# Altium integrated library Telephone.IntLib: 113 symbols (continued)
## CMP-009-00314-1
designator R?  value 47k  (hidden comment: CMP-009-00314-1)
High Precision-High Stability Chip Resistor Thin Film 0805 47kOhm 1% Paper T/R; Manufacturer: Yageo; Manufacturer Part Number: RT0805FRE0747KL; Power Rating: 125mW; Voltage Rating: 150V; Temperature Coefficient: 50ppm/°C; RoHS: Yes; Category: Chip SMD Resistors; Stock 1: 83330; Pricing 1: 1=0.1, 10=0.081, 50=0.081, 100=0.031, 1000=0.014, 10000=0.009 (USD); Case/Package: 0805; Case Code (Metric): 2012; Min Operating Temperature: -55°C; Max Operating Temperature: 125°C; Tolerance: 1%; Packaging: Tape and Reel; Resistor Type: Thin Film; Termination: SMD/SMT; Number of Terminations: 2; Max Power Dissipation: 125mW; Voltage Rating (DC): 150V; Features: Moisture Resistant; Series: RT; Resistance Tolerance: 1%; Length: 0.079inch; Width: 0.049inch; Height: 0.024inch; Reach SVHC Compliant: No; Lead Free: Lead Free; RoHS Compliant: Yes; ComponentLink1URL: https://datasheet.ciiva.com/7942/1392914-7942152.pdf?src-supplier=Element14; ComponentLink1Description: https://datasheet.ciiva.com/7942/1392914-7942152.pdf?src-supplier=Element14; ComponentLink2URL: https://datasheet.ciiva.com/7942/1392914-7942153.pdf?src-supplier=Element14; ComponentLink2Description: https://datasheet.ciiva.com/7942/1392914-7942153.pdf?src-supplier=Element14; ComponentLink3URL: https://datasheet.ciiva.com/5990/1392914-5990606.pdf?src-supplier=Farnell; ComponentLink3Description: https://datasheet.ciiva.com/5990/1392914-5990606.pdf?src-supplier=Farnell; Pins: 2; Design Item ID: RT0805FRE0747KL; Component Type: Standard; Pin Count: 2; Source: V4-TEL.SCHLIB; Component Type: Resistors
footprint 0805
pins: 1, 2

## CMP-009-00315-1
designator R?  value 2.2k  (hidden comment: CMP-009-00315-1)
anti-surge endured pulse power thick film chip resistor, 0805, RoHS; Manufacturer: KOA Speer; Manufacturer Part Number: SG73P2ATTD222J; Voltage Rating: 150V; Power Rating: 250mW; Tolerance: 5%; Temperature Coefficient: 100ppm/°C; RoHS: Yes; Category: Chip SMD Resistors; Stock 1: 15000; Pricing 1: 1=0.13, 10=0.113, 50=0.113, 100=0.043, 1000=0.018, 10000=0.013 (USD); Case/Package: 0805; Case Code (Metric): 2012; Weight: 0.000194oz; Min Operating Temperature: -55°C; Max Operating Temperature: 155°C; Packaging: Tape and Reel; Termination: SMD/SMT; Voltage Rating (DC): 150V; Series: SG73P; Features: Moisture Resistant,Automotive AEC-Q200; Max Power Dissipation: 250mW; Number of Terminations: 2; Length: 2mm; Width: 1.25mm; Height: 0.5mm; Ratings: AEC-Q200; RoHS Compliant: Yes; ComponentLink1URL: https://datasheet.ciiva.com/5568/sg73-5568998.pdf?src-supplier=Mouser; ComponentLink1Description: https://datasheet.ciiva.com/5568/sg73-5568998.pdf?src-supplier=Mouser; Design Item ID: SG73P2ATTD222J; Component Type: Standard; Pin Count: 2; Source: V4-TEL.SCHLIB; Component Type: Resistors
footprint 0805
pins: 1, 2

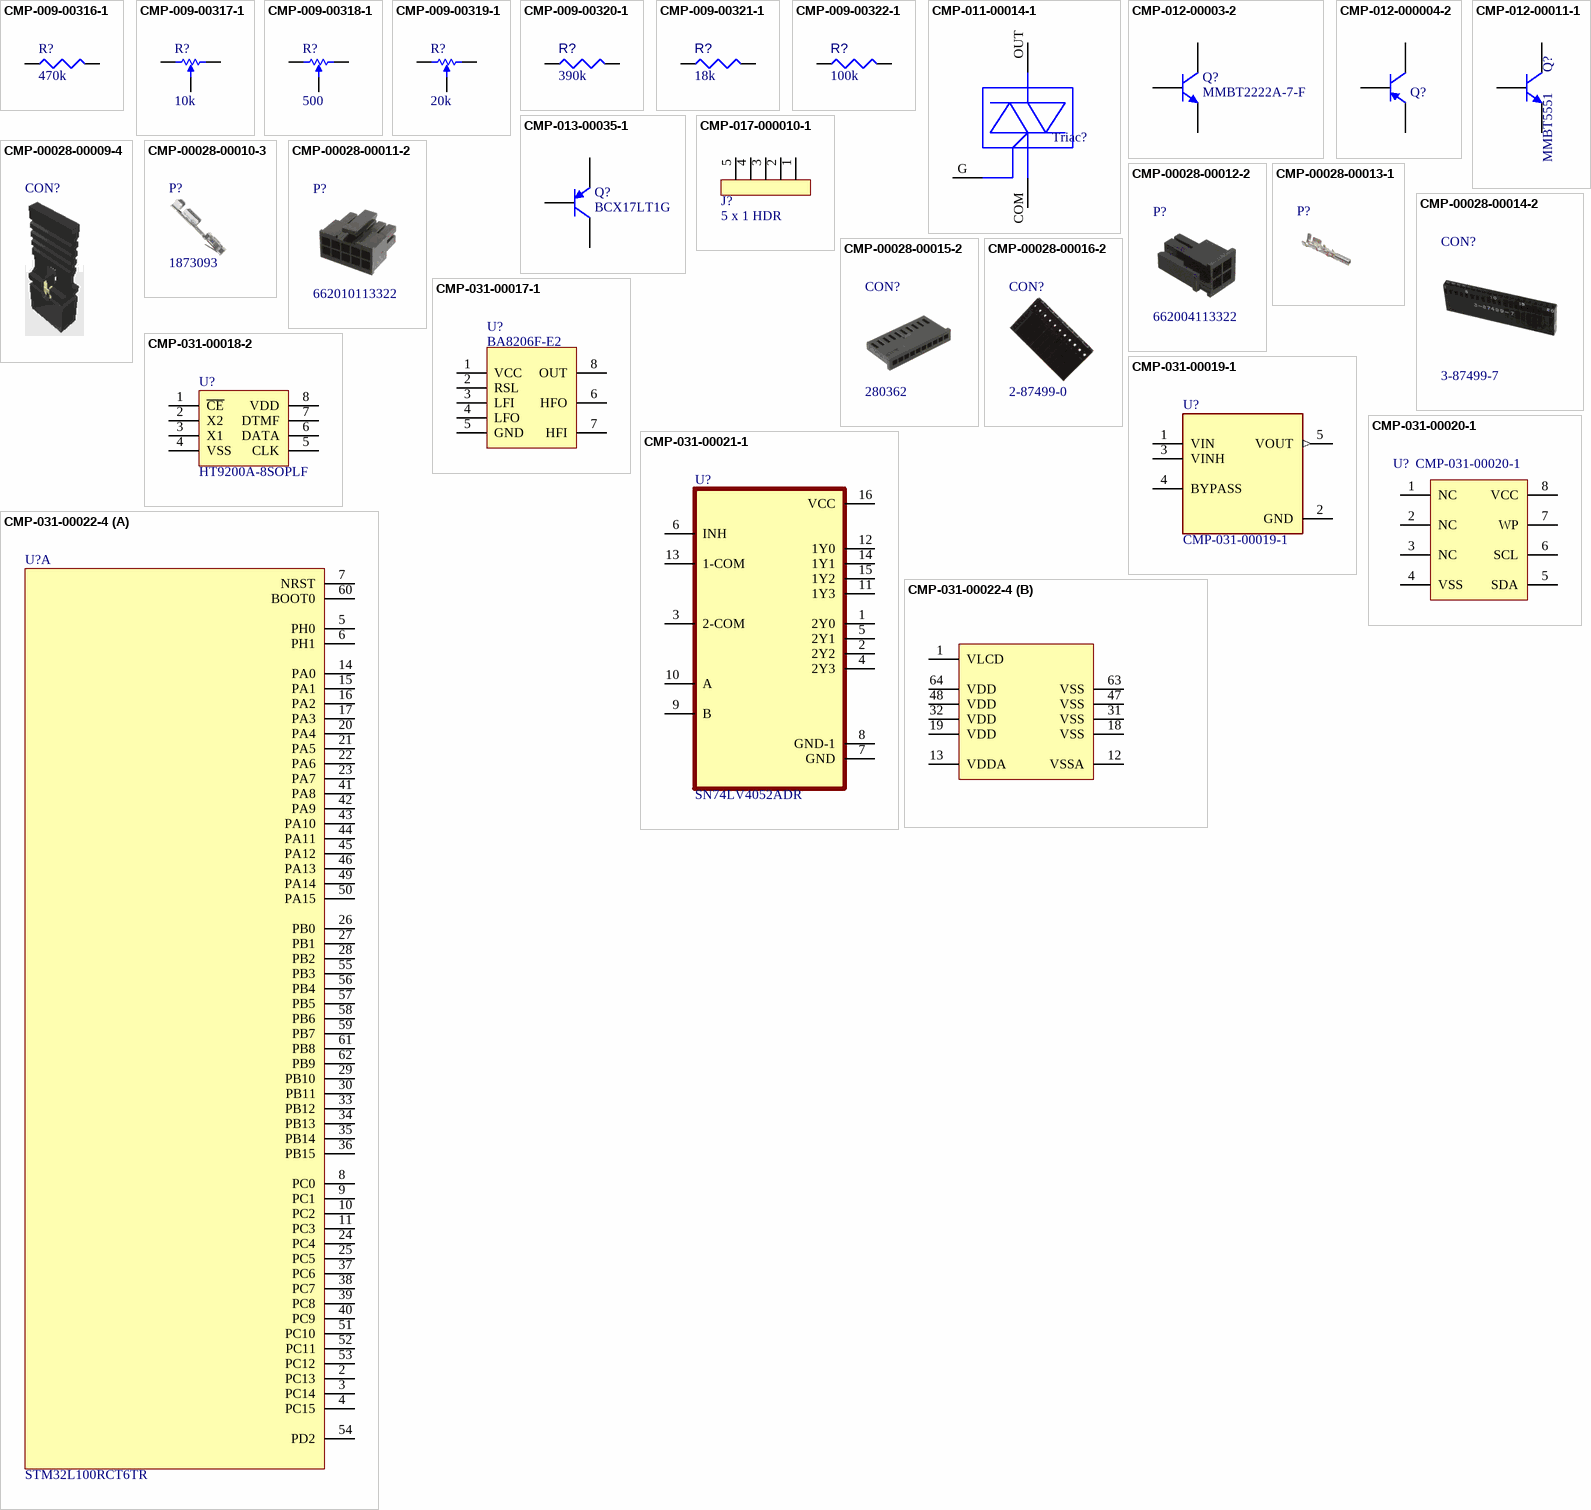
[diagram p2: symbols CMP-009-00316-1 to CMP-031-00022-4]

## CMP-009-00316-1
designator R?  value 470k  (hidden comment: CMP-009-00316-1)
Surface Mount Chip Resistor, Thick Film, Aec-Q200 Wcr Series, 470 Kohm, 125 Mw, 1%, 150 V Rohs Compliant: Yes; Manufacturer: TT Welwyn; Manufacturer Part Number: WCR0805-470KFI; Power Rating: 125mW; Voltage Rating: 150V; Insulation Resistance: 1GR; Temperature Coefficient: 100ppm/°C; RoHS: Yes; Category: Chip SMD Resistors; Stock 1: 11638; Pricing 1: 1=0.1, 10=0.084, 50=0.084, 100=0.033, 1000=0.015, 10000=0.01 (USD); Case/Package: 0805; Case Code (Metric): 2012; Min Operating Temperature: -55°C; Max Operating Temperature: 155°C; Packaging: Cut Tape; Resistor Type: Thick Film; Voltage Rating (DC): 150V; Resistance Tolerance: 1%; Series: WCR; Width: 1.25mm; Reach SVHC Compliant: No; RoHS Compliant: Yes; ComponentLink1URL: https://datasheet.ciiva.com/7867/1851687-7867286.pdf?src-supplier=Element14; ComponentLink1Description: https://datasheet.ciiva.com/7867/1851687-7867286.pdf?src-supplier=Element14; ComponentLink2URL: https://datasheet.ciiva.com/7867/1851687-7867287.pdf?src-supplier=Element14; ComponentLink2Description: https://datasheet.ciiva.com/7867/1851687-7867287.pdf?src-supplier=Element14; Pins: 2; Design Item ID: WCR0805-470KFI; Component Type: Standard; Pin Count: 2; Source: V4-TEL.SCHLIB; Component Type: Resistors
footprint 0805
pins: 1, 2

## CMP-009-00317-1
designator R?, comment value 10k  (hidden comment: TC33X-2-103G)
Res Trimmer 10K Ohm 25% 1/10W 1(Elec)/1(Mech)Turn (3 X 3.8mm) Foot Print SMD Embossed T/R; Manufacturer: Bourns; Max Power Dissipation: 100mW; Temperature Coefficient: 250ppm/°C; Max Operating Temperature: 100°C; Min Operating Temperature: -40°C; Mounting Technology: Surface Mount; RoHS Compliant: Yes; Tolerance: 25%; Depth: 3.8mm; Height: 0.047inch; Length: 0.15inch; Military Standard: Not; Package Quantity: 9000; Packaging: Tape and Reel; Power Rating: 100mW; Radiation Hardening: No; Resistor Type: Cermet; Series: Trimpot® TC33 - Open Frame; Termination: SMD/SMT; Width: 0.118inch; Manufacturer Part Number: TC33X-2-103G; Component Type: Resistors
footprint BI-35WR10KLFTR-3_V (SMD, 3-Leads, Body 3x3.1mm)
pins: 1, 2, 3

## CMP-009-00318-1
designator R?, comment value 500  (hidden comment: TC33X-2-501E)
Res Trimmer 500 Ohm 25% 1/10W 1(Elec)/1(Mech)Turn (3 X 3.8mm) Foot Print SMD Embossed T/R; Manufacturer: Bourns; Power: 100mW; Number of Turns: 1; Temperature Coefficient: 250ppm/°C; Case/Package: TC33X-2; RoHS Compliant: Yes; Mounting Technology: Surface Mount; Max Operating Temperature: 100°C; Min Operating Temperature: -40°C; Tolerance: 25%; Height: 0.047inch; Length: 0.15inch; Max Power Dissipation: 100mW; Package Quantity: 1; Packaging: Tape and Reel; Power Rating: 100mW; Radiation Hardening: No; Reach SVHC Compliant: No; Resistance Tolerance: 25%; Resistor Type: Cermet; Series: Trimpot® TC33 - Open Frame; Termination: SMD/SMT; Width: 0.118inch; Manufacturer Part Number: TC33X-2-501E; Component Type: Resistors
footprint BOUR-TC33X-2_V (SMD, 3-Leads, Body 3.8x3.6mm)
pins: 1, 2, 3

## CMP-009-00319-1
designator R?, comment value 20k  (hidden comment: TC33X-2-203E)
Res Trimmer 20K Ohm 25% 1/10W 1(Elec)/1(Mech)Turn (3 X 3.8mm) Foot Print SMD Embossed T/R; Manufacturer: Bourns; Power: 100mW; Number of Turns: 1; Temperature Coefficient: 250ppm/°C; RoHS Compliant: Yes; Mounting Technology: Surface Mount; Max Operating Temperature: 100°C; Min Operating Temperature: -40°C; Tolerance: 25%; Pins: 3; Depth: 3.8mm; Height: 0.047inch; Length: 3mm; Max Power Dissipation: 100mW; Military Standard: Not; Package Quantity: 1; Packaging: Tape and Reel; Power Rating: 100mW; Radiation Hardening: No; Reach SVHC Compliant: No; Resistance Tolerance: 25%; Resistor Type: Cermet; Series: TC33; Termination: Foot Print; Width: 0.118inch; Manufacturer Part Number: TC33X-2-203E; Component Type: Resistors
footprint BOUR-TC33X-2_V (SMD, 3-Leads, Body 3.8x3.6mm)
pins: 1, 2, 3

## CMP-009-00320-1
designator R?  value 390k  (hidden comment: CMP-009-00320-1)
Chip Resistor Precision Grade Thick Film 0805 390kOhm 1% Paper T/R; Manufacturer: Yageo; Manufacturer Part Number: RE0805FRE07390KL; Max Power Dissipation: 125mW; Temperature Coefficient: 50ppm/°C; Case/Package: 0805; Min Operating Temperature: -55°C; Max Operating Temperature: 155°C; Packaging: Tape and Reel; Number of Terminations: 2; Tolerance: 1%; Features: Moisture Resistant; Series: RE; Length: 0.079inch; Width: 0.049inch; Height: 0.024inch; Lead Free: Lead Free; RoHS Compliant: Yes; Component Type: Resistors
footprint R0805
pins: 1, 2
1 alternate drawing of the same symbol

## CMP-009-00321-1
designator R?  value 18k  (hidden comment: CMP-009-00321-1)
Res Thick Film 0805 18K Ohm 1% 1/8W ±100ppm/°C Molded SMD SMD Paper T/R; Manufacturer: Yageo; Manufacturer Part Number: RC0805FR-1018KL; Power: 125mW; Case/Package: 0805; Contact Plating: Tin,Matte; Min Operating Temperature: -55°C; Max Operating Temperature: 155°C; Tolerance: 1%; RoHS Compliant: Yes; Mounting Technology: SMT; Pins: 2; Component Type: Resistors
footprint R0805
pins: 1, 2
1 alternate drawing of the same symbol

## CMP-009-00322-1
designator R?, comment value 100k  (hidden comment: RC0805FR-07100KL)
Res Thick Film 0805 100K Ohm 1% 1/8W ±100ppm/°C Molded SMD Paper T/R; Manufacturer: Yageo; Power: 125mW; Voltage Rating: 150V; Case/Package: 0805; Pins: 2; RoHS Compliant: True; Mounting Technology: SM; Tolerance: 1%; Max Operating Temperature: 155°C; Min Operating Temperature: -55°C; Contact Plating: Tin,Matte; Height: 500um; Lead Free: Lead Free; Length: 2mm; Packaging: Cut Tape; Radiation Hardening: No; Reach SVHC Compliant: Yes; Resistor Type: Thick Film; Temperature Coefficient: 100ppm/°C; Voltage Rating (DC): 150V; Width: 1.25mm; Manufacturer Part Number: RC0805FR-07100KL; Component Type: Resistors
footprint R0805
pins: 1, 2
1 alternate drawing of the same symbol

## CMP-011-00014-1
designator Triac?, comment ACST210-8BTR  (value not drawn)
Triacs Triac Crowbar 10mA Switch 2A 800V; Manufacturer 1: STMicroelectronics; Element Configuration: Single; RoHS: Yes; Category: TRIACs; Pricing 1: 1=0.75000, 10=0.65700 (USD); Mount: Surface Mount; Case/Package: DPAK; Weight: 0.009185oz; Min Operating Temperature: -40°C; Max Operating Temperature: 125°C; Packaging: Tape and Reel; Package Quantity: 2500; RMS Current (Irms): 2A; Hold Current: 10mA; Series: ACS™/A.S.D®; Radiation Hardening: No; Lead Free: Lead Free; RoHS Compliant: Yes; ComponentLink1URL: https://datasheet.ciiva.com/15140/getdatasheetpartid-256875-15140675.pdf?src-supplier=Verical; ComponentLink1Description: https://datasheet.ciiva.com/15140/getdatasheetpartid-256875-15140675.pdf?src-supplier=Verical; Pins: 3; Voltage Rating: 800V; Design Item ID: ACST210-8BTR; Contact Plating: Tin,Matte; Manufacturer Part Number 1: ACST210-8BTR; Source: PTZLib.SchLib; Stock 1: 60; ComponentLink2Description: https://datasheet.ciiva.com/17423/cd00153575-17423141.pdf?src-supplier=Avnet+Europe; ComponentLink2URL: https://datasheet.ciiva.com/17423/cd00153575-17423141.pdf?src-supplier=Avnet+Europe; Component Type: Switches
footprint ACST210_DPAK
pins: COM 3, G 2, OUT 1

## CMP-012-00003-2
designator Q?, comment MMBT2222A-7-F
MMBT2222 Series NPN 350 mW 40 V 600 mA SMT Small Signal Transistor - SOT-23; Manufacturer: Diodes; Manufacturer: Multicomp; Current Rating: 600mA; Voltage Rating: 40V; Collector Base Voltage (VCBO): 75V; Collector Emitter Saturation Voltage: 1V; Current: 1A; Element Configuration: Single; Emitter Base Voltage (VEBO): 6V; Frequency: 300MHz; hFE Min: 100; Max Power Dissipation: 300mW; Number of Elements: 1; Power Dissipation: 350mW; Case/Package: SOT-23-3; Pins: 3; RoHS Compliant: Yes; Min Operating Temperature: -55°C; Max Operating Temperature: 150°C; Design Item ID: MMBT2222A-7-F; Category: BJTs; Collector Emitter Breakdown Voltage: 40V; Collector Emitter Voltage (VCEO): 40V; Collector-emitter Voltage-Max: 1V; Component Type: Standard; Contact Plating: Tin,Matte; Continuous Collector Current: 600mA; Gain Bandwidth Product: 300MHz; Height: 1mm; Lead Free: Lead Free; Length: 3.05mm; Manufacturer Part Number: MMBT2222A-7-F; Max Collector Current: 600mA; Max Frequency: 300MHz; Mount: Surface Mount; Package Quantity: 3000; Packaging: Tape and Reel; Pin Count: 3; Polarity: NPN; Pricing 1: 1=0.14000, 10=0.13300, 50=0.13300, 100=0.07200, 500=0.04500, 1000=0.03100, 3000=0.02300, 9000=0.02000, 10000=0.02000, 24000=0.01800, 45000=0.01500 (USD); Radiation Hardening: No; Reach SVHC Compliant: Yes; RoHS: Yes; Series: Automotive, AEC-Q101; Source: PTZ.SCHLIB; Stock 1: 1743698; Termination: SMD/SMT; Transition Frequency: 300MHz; Voltage: 40V; Voltage Rating (DC): 40V; Weight: 0.000282oz; Width: 1.4mm; ComponentLink1Description: https://datasheet.ciiva.com/15139/getdatasheetpartid-82692-15139078.pdf?src-supplier=Verical; ComponentLink1URL: https://datasheet.ciiva.com/15139/getdatasheetpartid-82692-15139078.pdf?src-supplier=Verical; ComponentLink2Description: https://datasheet.ciiva.com/8029/ds30041-8029709.pdf?src-supplier=Element14; ComponentLink2URL: https://datasheet.ciiva.com/8029/ds30041-8029709.pdf?src-supplier=Element14; ComponentLink3Description: https://datasheet.ciiva.com/11201/ds30041-11201864.pdf?src-supplier=Avnet; ComponentLink3URL: https://datasheet.ciiva.com/11201/ds30041-11201864.pdf?src-supplier=Avnet; ComponentLink4Description: https://datasheet.ciiva.com/16199/ds30041-16199045.pdf?src-supplier=Future+Electronics; ComponentLink4URL: https://datasheet.ciiva.com/16199/ds30041-16199045.pdf?src-supplier=Future+Electronics; ComponentLink5Description: https://datasheet.ciiva.com/11198/ds30041-11198965.pdf?src-supplier=Avnet; ComponentLink5URL: https://datasheet.ciiva.com/11198/ds30041-11198965.pdf?src-supplier=Avnet; ComponentLink6Description: https://datasheet.ciiva.com/972/ds30041-972551.pdf?src-supplier=Digi-Key; ComponentLink6URL: https://datasheet.ciiva.com/972/ds30041-972551.pdf?src-supplier=Digi-Key; ComponentLink7Description: https://datasheet.ciiva.com/972/ds30041-972552.pdf?src-supplier=Digi-Key; ComponentLink7URL: https://datasheet.ciiva.com/972/ds30041-972552.pdf?src-supplier=Digi-Key; ComponentLink8Description: https://datasheet.ciiva.com/972/ds30041-972550.pdf?src-supplier=Digi-Key; ComponentLink8URL: https://datasheet.ciiva.com/972/ds30041-972550.pdf?src-supplier=Digi-Key; Component Type: Transformers
footprint SOT23127P600-8N
pins: 1 E, 2 B, 3 C

## CMP-012-000004-2
designator Q?, comment MPSA92PBFREE  (value not drawn)
MPSA92 Series 300 V 500 mA PNP Through Hole Silicon Transistor - TO-92; Manufacturer: Central Semiconductor; Manufacturer Part Number: MPSA92PBFREE; RoHS: Yes; Stock 1: 81433; Pricing 1: 1=0.51, 10=0.438, 50=0.438, 100=0.327, 1000=0.19, 10000=0.146 (USD); Design Item ID: MPSA92PBFREE; Source: V4-TEL.SCHLIB; Component Type: Standard; Pin Count: 3; Component Type: Mechanicals
footprint UNIC-TO-92-3 (TO-92, 3-Leads, Dia 4.58mm, Pitch 1.27mm)
pins: 1 E, 2 B, 3 C

## CMP-012-00011-1
designator Q?, comment MMBT5551
Bipolar Transistor, SOT-23, 160V, 600mA; Manufacturer: ON Semiconductor; Manufacturer Part Number: MMBT5551LT1G; Manufacturer: Diodes; Case/Package: SOT-23; RoHS Compliant: Yes; Reach SVHC Compliant: Yes; Manufacturer Part Number: MMBT5551; Component Type: Transformers
footprint SOT23127P600-8N
pins: 1 E, 2 B, 3 C

## CMP-013-00035-1
designator Q?, comment BCX17LT1G
ON Semi BCX17LT1G PNP Bipolar Transistor; 0.5 A; 45 V; 3-Pin SOT-23; Manufacturer: ON Semiconductor; Manufacturer: Rochester Electronics; Manufacturer Part Number: NSVBCX17LT1G; Nominal Vgs: 5V; Continuous Collector Current: 500mA; Case/Package: SOT-23-3; Min Operating Temperature: -55°C; Pins: 3; Max Operating Temperature: 150°C; Mounting Technology: SMD/SMT; Transistor Type: PNP; Manufacturer Part Number: BCX17LT1G; Component Type: Transistors
footprint FAIR-SOT23-3_V (SOT23, 3-Leads, Body 3.12x1.5mm, Pitch 0.95mm)
pins: 1 B, 2 E, 3 C

## CMP-017-000010-1
designator J?, comment 5 x 1 HDR
Manufacturer Part # :   9-146278-0; Design Item ID: 5 x 1 HDR; Source: PTZLib.SchLib
footprint HDR_male_1x5_2.54mm
pins: 1, 2, 3, 4, 5

## CMP-00028-00009-4
designator CON?, comment 609002115121  (value not drawn)  (mechanical)
Insulated WR-PHD Jumper with Testpoint, 3A, 1 x 2, 2.54mm Pitch; Pins: 2; Component Type: Mechanical
footprint 609002115121-Footprint-1

## CMP-00028-00010-3
designator P?, comment 1873093  (mechanical)
CONN SOCKET 20-24AWG TIN CRIMP; Manufacturer: TE Connectivity; Approvals: CSA; Contact Current Rating: 3A; Contact Resistance: 12mR; Gender: Female; Insulation Diameter: 1.75mm; Insulation Resistance: 5GR; Shielding: Unshielded; Voltage Rating (AC): 250V; Wire Gauge (Max): 20AWG; Wire Gauge (Min): 24AWG; Wire/Cable Type: Discrete; Max Operating Temperature: 105°C; Min Operating Temperature: -65°C; Mounting Technology: Cable; Connector Type: Socket; Contact Gender: Female; Contact Material: Bronze; Contact Plating: Tin; Contact Type: Signal; Current Rating: 3A; Depth: 2.41mm; ELV: Compliant; Height: 2.03mm; Lead Free: Lead Free; Length: 12.24mm; Orientation: Straight; Package Quantity: 1000; Packaging: Loose Piece; Reach SVHC Compliant: No; Series: AMPMODU Mod V; Termination: Crimp; Wire/Cable Gauge: 24AWG; Manufacturer Part Number: 1873093; Component Type: Mechanical

## CMP-00028-00011-2
designator P?, comment 662010113322  (mechanical)
WR-MPC3 Series 3mm Pitch 10 Way 2 Row Female Straight PCB Connector Housing 6620; Manufacturer: Wurth Electronics; Connector Type: Receptacle; Current Rating: 5A; Insulation: Insulated; Insulation Resistance: 1GR; Number of Contacts: 10; Voltage Rating: 250V; Max Operating Temperature: 105°C; Min Operating Temperature: -25°C; Mounting Technology: Free Hanging; RoHS Compliant: Yes; Color: Black; Contact Gender: Female; Contact Type: Female Socket; Fastening Type: Latch; Flammability Rating: UL94 V-0; Gender: Receptacle; Height: 14mm; Housing Material: Nylon; Length: 15.85mm; Number of Positions: 10; Number of Rows: 2; Packaging: Tray; Pitch: 3mm; Reach SVHC Compliant: Unknown; Series: WR-MPC3; Termination: Crimp; Width: 15.85mm; Manufacturer Part Number: 662010113322; Component Type: Mechanical
footprint 662010113322-Footprint-1

## CMP-00028-00012-2
designator P?, comment 662004113322  (mechanical)
WR-MPC3 Series 3mm Pitch 4 Way 2 Row Female Straight PCB Connector Housing 6620; Manufacturer: Wurth Electronics; Connector Type: Receptacle; Current Rating: 5A; Insulation Resistance: 1GR; Number of Contacts: 4; Voltage Rating: 250V; Max Operating Temperature: 105°C; Min Operating Temperature: -25°C; Mounting Technology: Free Hanging; RoHS Compliant: Yes; Color: Black; Contact Type: Female Socket; Fastening Type: Latch; Flammability Rating: UL94 V-0; Gender: Receptacle; Height: 14mm; Housing Material: Nylon; Length: 10.6mm; Number of Positions: 4; Number of Rows: 2; Packaging: Bulk; Pitch: 3mm; Reach SVHC Compliant: Unknown; Row Spacing: 3mm; Series: WR-MPC3; Termination: Crimp; Width: 6.85mm; Manufacturer Part Number: 662004113322; Component Type: Mechanical
footprint 662004113322-Footprint-1

## CMP-00028-00013-1
designator P?, comment 66200113722DEC  (value not drawn)  (mechanical)
WR-MPC3 Series Female Tin Plated CopperAlloy DIN Connector Contact; Manufacturer: Wurth Electronics; Contact Design: STAMPED; Current Rating: 5A; Pitch: 3mm; Wire Gauge (Max): 24AWG; Wire Gauge (Min): 20AWG; Pins: 1; Contact Gender: Female; Contact Material: Copper,Tin; Contact Plating: Tin; Height: 2.4mm; Length: 2.6mm; Reach SVHC Compliant: Unknown; Series: WR-MPC3; Termination: Crimp; Width: 15.3mm; Manufacturer Part Number: 66200113722DEC; Component Type: Mechanical

## CMP-00028-00014-2
designator CON?, comment 3-87499-7  (mechanical)
Housing, Crimp / Snap, Single Row, 20 250 VAC, 3 A 750 V, AMPMODU Mod IV Series; Manufacturer: TE Connectivity; Approvals: CSA; Connector Type: Receptacle,Socket; Contact Current Rating: 3A; Gender: Receptacle; Insulation Resistance: 5GR; Mating Alignment: No (Without); Max Voltage Rating (AC): 250V; Number of Contacts: 20; Pitch: 2.54mm; Row Spacing: 0.1inch; Max Operating Temperature: 105°C; Min Operating Temperature: -65°C; Mounting Technology: Free Hanging,Cable; Pins: 20; Color: Black; Contact Material: Copper; Contact Type: Male or Female; Current Rating: 3A; Depth: 15.24mm; ELV: Compliant; Flammability Rating: UL94 V-0; Height: 0.14inch; Housing Color: Black; Housing Material: Thermoplastic; Lead Free: Lead Free; Length: 2.01inch; Mating Connector Lock: No (Without); Number of Positions: 20; Number of Rows: 1; Orientation: Straight; Package Quantity: 200; Packaging: Bag; Reach SVHC Compliant: Unknown; Series: AMPMODU MOD IV; Strain Relief: No (Without); Termination: Crimp; Voltage Rating (AC): 250V; Width: 15.24mm; Manufacturer Part Number: 3-87499-7; Component Type: Mechanical

## CMP-00028-00015-2
designator CON?, comment 280362  (mechanical)
Headers & Wire Housings 10 POS RECPT; Manufacturer: TE Connectivity; Pins: 10; Manufacturer Part Number: 280362; Component Type: Mechanical

## CMP-00028-00016-2
designator CON?, comment 2-87499-0  (mechanical)
Conn Housing RCP 11 POS 2.54mm Crimp ST Cable Mount Package; Manufacturer: TE Connectivity; Approvals: CSA; Connector Type: Receptacle,Socket; Contact Current Rating: 3A; Insulation Resistance: 5GR; Mating Alignment: No (Without); Max Voltage Rating (AC): 250V; Number of Contacts: 11; Row Spacing: 0.1inch; Max Operating Temperature: 105°C; Min Operating Temperature: -65°C; Mounting Technology: Free Hanging; Color: Black; Contact Gender: Female; Contact Material: Copper; Contact Type: Female Socket; Current Rating: 3A; Depth: 15.24mm; ELV: Compliant; Flammability Rating: UL94 V-0; Height: 3.56mm; Housing Color: Black; Housing Material: Thermoplastic; Lead Free: Not Applicable; Length: 1.11inch; Mating Connector Lock: No (Without); Number of Positions: 11; Number of Rows: 1; Orientation: Straight; Package Quantity: 1; Packaging: Bulk; Pitch: 2.54mm; Radiation Hardening: No; Series: AMPMODU MOD IV; Strain Relief: No (Without); Termination: Crimp; Voltage Rating (AC): 250V; Manufacturer Part Number: 2-87499-0; Component Type: Mechanical

## CMP-031-00017-1
designator U?, comment BA8206F-E2
BA8206 Series 14 to 18 V 450 mW Tone Ringer IC for Telephone Set - SOIC-8; Manufacturer: Rohm; Number of Circuits: 1; Max Power Dissipation: 450mW; Manufacturer Part Number: BA8206F-E2; RoHS: Yes; Category: Integrated Circuits (ICs); Stock 1: 6538; Pricing 1: 1=2.37, 10=2.14, 50=2.02, 100=1.72, 1000=1.3, 10000=1.06 (USD); Mount: Surface Mount; Case/Package: SOP; Min Operating Temperature: -25°C; Max Operating Temperature: 75°C; Packaging: Tape and Reel; Package Quantity: 2500; Series: -; Lead Free: Lead Free; RoHS Compliant: Yes; ComponentLink1URL: https://datasheet.ciiva.com/6631/ba8206f-6631483.pdf?src-supplier=Digi-Key; ComponentLink1Description: https://datasheet.ciiva.com/6631/ba8206f-6631483.pdf?src-supplier=Digi-Key; ComponentLink2URL: https://datasheet.ciiva.com/6631/ba8206f-6631484.pdf?src-supplier=Digi-Key; ComponentLink2Description: https://datasheet.ciiva.com/6631/ba8206f-6631484.pdf?src-supplier=Digi-Key; ComponentLink3URL: https://datasheet.ciiva.com/16421/rohmba8206f-e2-16421738.pdf?src-supplier=Future+Electronics; ComponentLink3Description: https://datasheet.ciiva.com/16421/rohmba8206f-e2-16421738.pdf?src-supplier=Future+Electronics; ComponentLink4URL: https://datasheet.ciiva.com/6631/ba8206f-6631485.pdf?src-supplier=Digi-Key; ComponentLink4Description: https://datasheet.ciiva.com/6631/ba8206f-6631485.pdf?src-supplier=Digi-Key; Pins: 8; Design Item ID: BA8206F-E2; Component Type: Standard; Pin Count: 8; Source: V4-TEL.SCHLIB; Component Type: Integrated Circuits
footprint BA8206
pins: 1 VCC, 2 RSL, 3 LFI, 4 LFO, 5 GND, 6 HFO, 7 HFI, 8 OUT

## CMP-031-00018-2
designator U?, comment HT9200A-8SOPLF
IC, Dtmf Generator, SMD, SOP8; Manufacturer: Holtek; Min Supply Voltage: 2.5V; Max Supply Voltage: 5.5V; Nominal Supply Current: 950uA; Manufacturer Part Number: HT9200A-8SOPLF; Category: Integrated Circuits (ICs); Pins: 8; Min Operating Temperature: -20°C; Max Operating Temperature: 75°C; Reach SVHC Compliant: No; ComponentLink1URL: https://datasheet.ciiva.com/1167/1738900-1167188.pdf?src-supplier=Element14; ComponentLink1Description: https://datasheet.ciiva.com/1167/1738900-1167188.pdf?src-supplier=Element14; Component Type: Standard; RoHS Compliant: Yes; Component Type: Integrated Circuits
footprint SSOIC8
pins: 1 ~{CE}, 2 X2, 3 X1, 4 VSS, 5 CLK, 6 DATA, 7 DTMF, 8 VDD

## CMP-031-00019-1
designator U?
Linear Voltage Regulator IC Positive Fixed 1 Output 3.3V 150mA SOT-23-5; Manufacturer: STMicroelectronics; Manufacturer Part Number: LD3985M33R; Number of Outputs: 1; Max Supply Voltage: 6V; Dropout Voltage: 400uV; Input Bias Current: 85uA; Quiescent Current: 150uA; Max Supply Current: 250uA; Power Supply Rejection Ratio (PSRR): 50dB; Min Supply Voltage: 2.5V; RoHS: Yes; Category: Voltage Regulators - Linear; Stock: 76764; Pricing: 1=0.93, 10=0.832, 50=0.79, 100=0.649, 1000=0.424, 10000=0.39 (USD); Mounting Technology: Surface Mount; Case/Package: SOT-23-5; Pins: 5; Weight: 0.000222oz; Min Operating Temperature: -40°C; Max Operating Temperature: 125°C; Packaging: Cut Tape; Output Voltage: 3.3V; Package Quantity: 3000; Output Current: 150mA; Number of Regulators: 1; Min Output Voltage: 3.3V; Polarity: Positive; Output Type: Fixed; Series: -; Output Configuration: Positive; Length: 3mm; Width: 1.75mm; Height: 1.3mm; Lead Free: Lead Free; RoHS Compliant: Yes; ComponentLink1URL: https://datasheet.ciiva.com/41440/001185181-da-01-en-ic-reg-ldo-3-3v-ld3985m33r-sot-23-5-stm-41440289.pdf?src-supplier=Conrad; ComponentLink1Description: https://datasheet.ciiva.com/41440/001185181-da-01-en-ic-reg-ldo-3-3v-ld3985m33r-sot-23-5-stm-41440289.pdf?src-supplier=Conrad; ComponentLink2URL: https://datasheet.ciiva.com/2042/cd00003395-2042199.pdf?src-supplier=Digi-Key; ComponentLink2Description: https://datasheet.ciiva.com/2042/cd00003395-2042199.pdf?src-supplier=Digi-Key; ComponentLink3URL: https://datasheet.ciiva.com/2042/cd00003395-2042198.pdf?src-supplier=Digi-Key; ComponentLink3Description: https://datasheet.ciiva.com/2042/cd00003395-2042198.pdf?src-supplier=Digi-Key; ComponentLink4URL: https://datasheet.ciiva.com/2042/cd00003395-2042200.pdf?src-supplier=Digi-Key; ComponentLink4Description: https://datasheet.ciiva.com/2042/cd00003395-2042200.pdf?src-supplier=Digi-Key; Design Item ID: LD3985M33R; Component Type: Standard; Pin Count: 5; Source: V4-TEL.SCHLIB; Component Type: Integrated Circuits
footprint LM
pins: 1 VIN, 2 GND (power), 3 VINH, 4 BYPASS, 5 VOUT (out)

## CMP-031-00020-1
designator U?
EEPROM Serial 16-Kb I2C - Automotive Grade; Manufacturer: ON Semiconductor; Manufacturer Part Number: NV24C16MUW3VLTBG; RoHS: No; Category: EEPROM; Pricing 1: 1=0.39, 10=0.374, 50=0.374, 100=0.307, 1000=0.291, 10000=0.276 (USD); Design Item ID: NV24C16MUW3VLTBG; Component Type: Standard; Pin Count: 8; Source: V4-TEL.SCHLIB; Component Type: Integrated Circuits
footprint NV24C16UV
pins: 1 NC, 2 NC, 3 NC, 4 VSS, 5 SDA, 6 SCL, 7 WP, 8 VCC

## CMP-031-00021-1
designator U?, comment SN74LV4052ADR
IC MULTIPLEXER DUAL 4X1 16SOIC; Manufacturer: Texas Instruments; Bandwidth: 50MHz; Propagation Delay: 12ns; Number of Inputs: 8; Number of Outputs: 2; Min Supply Voltage: 2V; Max Supply Voltage: 5.5V; Operating Supply Current: 20uA; Number of Bits: 4; Logic Function: Multiplexer,Demultiplexer; On-State Resistance: 100R; Supply Type: Single; Polarity: Non-Inverting; Throw Configuration: SP4T; Manufacturer Part Number: SN74LV4052ADR; RoHS: Yes; Category: Decoders and Multiplexers; Stock 1: 5424; Pricing 1: 1=0.42, 10=0.355, 50=0.355, 100=0.26, 1000=0.17, 10000=0.136 (USD); Mount: Surface Mount; Case/Package: SOIC; Weight: 0.004998oz; Min Operating Temperature: -40°C; Max Operating Temperature: 85°C; Packaging: Tape and Reel; Package Quantity: 1; Number of Channels: 2; Number of Circuits: 2; Series: 74LV; Number of Switches: 2; Supply Current: 20uA; Radiation Hardening: No; Lead Free: Lead Free; RoHS Compliant: Yes; Reach SVHC Compliant: No; ComponentLink1URL: https://datasheet.ciiva.com/1669/sn74lv4052a-1669728.pdf?src-supplier=Digi-Key; ComponentLink1Description: https://datasheet.ciiva.com/1669/sn74lv4052a-1669728.pdf?src-supplier=Digi-Key; ComponentLink2URL: https://datasheet.ciiva.com/15127/getdatasheetpartid-296403-15127637.pdf?src-supplier=Verical; ComponentLink2Description: https://datasheet.ciiva.com/15127/getdatasheetpartid-296403-15127637.pdf?src-supplier=Verical; ComponentLink3URL: https://datasheet.ciiva.com/46435/1845014-46435855.pdf?src-supplier=Element14; ComponentLink3Description: https://datasheet.ciiva.com/46435/1845014-46435855.pdf?src-supplier=Element14; ComponentLink4URL: https://datasheet.ciiva.com/1669/sn74lv4052a-1669727.pdf?src-supplier=Digi-Key; ComponentLink4Description: https://datasheet.ciiva.com/1669/sn74lv4052a-1669727.pdf?src-supplier=Digi-Key; ComponentLink5URL: https://datasheet.ciiva.com/1669/sn74lv4052a-1669729.pdf?src-supplier=Digi-Key; ComponentLink5Description: https://datasheet.ciiva.com/1669/sn74lv4052a-1669729.pdf?src-supplier=Digi-Key; ComponentLink6URL: https://datasheet.ciiva.com/14306/sn74lv4052a-14306682.pdf?src-supplier=Avnet; ComponentLink6Description: https://datasheet.ciiva.com/14306/sn74lv4052a-14306682.pdf?src-supplier=Avnet; ComponentLink7URL: https://datasheet.ciiva.com/48711/001048022-da-01-en-ic-mp-sn74lv40-sn74lv4052adr-soic-16-tid-48711974.pdf?src-supplier=Conrad; ComponentLink7Description: https://datasheet.ciiva.com/48711/001048022-da-01-en-ic-mp-sn74lv40-sn74lv4052adr-soic-16-tid-48711974.pdf?src-supplier=Conrad; Pins: 16; Design Item ID: SN74LV4052ADR; Component Type: Standard; Pin Count: 16; Source: V4-TEL.SCHLIB; Component Type: Integrated Circuits
footprint demultiplexer
pins: 1 2Y0, 2 2Y2, 3 2-COM, 4 2Y3, 5 2Y1, 6 INH, 7 GND (power), 8 GND-1 (power), 9 B, 10 A, 11 1Y3, 12 1Y0, 13 1-COM, 14 1Y1, 15 1Y2, 16 VCC (power)

## CMP-031-00022-4
designator U?, comment STM32L100RCT6TR
Ultra-low-power 32-bit Value Line ARM Cortex-M3 MCU with 256 Kbytes Flash, 32 MHz CPU, LCD, USB; Manufacturer: STMicroelectronics; Interface: I2C,SPI,USB,UART,USART; Memory Size: 256KB; Number of I/Os: 51; Oscillator Type: Internal; Peripherals: Brown-out Detect/Reset,POR,PWM,WDT,DMA,LCD; Case/Package: LQFP; RoHS Compliant: Yes; Min Operating Temperature: -40°C; Max Operating Temperature: 85°C; Design Item ID: STM32L100RCT6TR; Category: Microcontrollers; Component Type: Standard; Core Architecture: ARM; Manufacturer Part Number: STM32L100RCT6TR; Memory Format: FLASH; Packaging: Tape and Reel; Series: STM32 L1; ComponentLink1Description: http://www.mouser.com/ds/2/389/stm32l100rc-956221.pdf?src-supplier=Mouser; ComponentLink1URL: http://www.mouser.com/ds/2/389/stm32l100rc-956221.pdf?src-supplier=Mouser; ComponentLink2Description: http://www.st.com/content/ccc/resource/technical/document/datasheet/aa/5b/32/7b/98/10/4f/86/DM00090183.pdf/files/DM00090183.pdf/jcr:content/translations/en.DM00090183.pdf?src-supplier=Digi-Key; ComponentLink2URL: http://www.st.com/content/ccc/resource/technical/document/datasheet/aa/5b/32/7b/98/10/4f/86/DM00090183.pdf/files/DM00090183.pdf/jcr:content/translations/en.DM00090183.pdf?src-supplier=Digi-Key; ComponentLink3Description: http://www.st.com/st-web-ui/static/active/en/resource/technical/document/datasheet/DM00108661.pdf?src-supplier=Avnet; ComponentLink3URL: http://www.st.com/st-web-ui/static/active/en/resource/technical/document/datasheet/DM00108661.pdf?src-supplier=Avnet; Pins: 64; Component Type: Integrated Circuits
footprint STM32L100RCT6TR-Footprint-1
fpgapininfo STM32L100RCT6TR
part A pins: 2 PC13, 3 PC14, 4 PC15, 5 PH0, 6 PH1, 7 NRST, 8 PC0, 9 PC1, 10 PC2, 11 PC3, 14 PA0, 15 PA1, 16 PA2, 17 PA3, 20 PA4, 21 PA5, 22 PA6, 23 PA7, 24 PC4, 25 PC5, 26 PB0, 27 PB1, 28 PB2, 29 PB10, 30 PB11, 33 PB12, 34 PB13, 35 PB14, 36 PB15, 37 PC6, 38 PC7, 39 PC8, 40 PC9, 41 PA8, 42 PA9, 43 PA10, 44 PA11, 45 PA12, 46 PA13, 49 PA14, 50 PA15, 51 PC10, 52 PC11, 53 PC12, 54 PD2, 55 PB3, 56 PB4, 57 PB5, 58 PB6, 59 PB7, 60 BOOT0, 61 PB8, 62 PB9
part B pins: 1 VLCD (power), 12 VSSA (power), 13 VDDA (power), 18 VSS (power), 19 VDD (power), 31 VSS (power), 32 VDD (power), 47 VSS (power), 48 VDD (power), 63 VSS (power), 64 VDD (power)

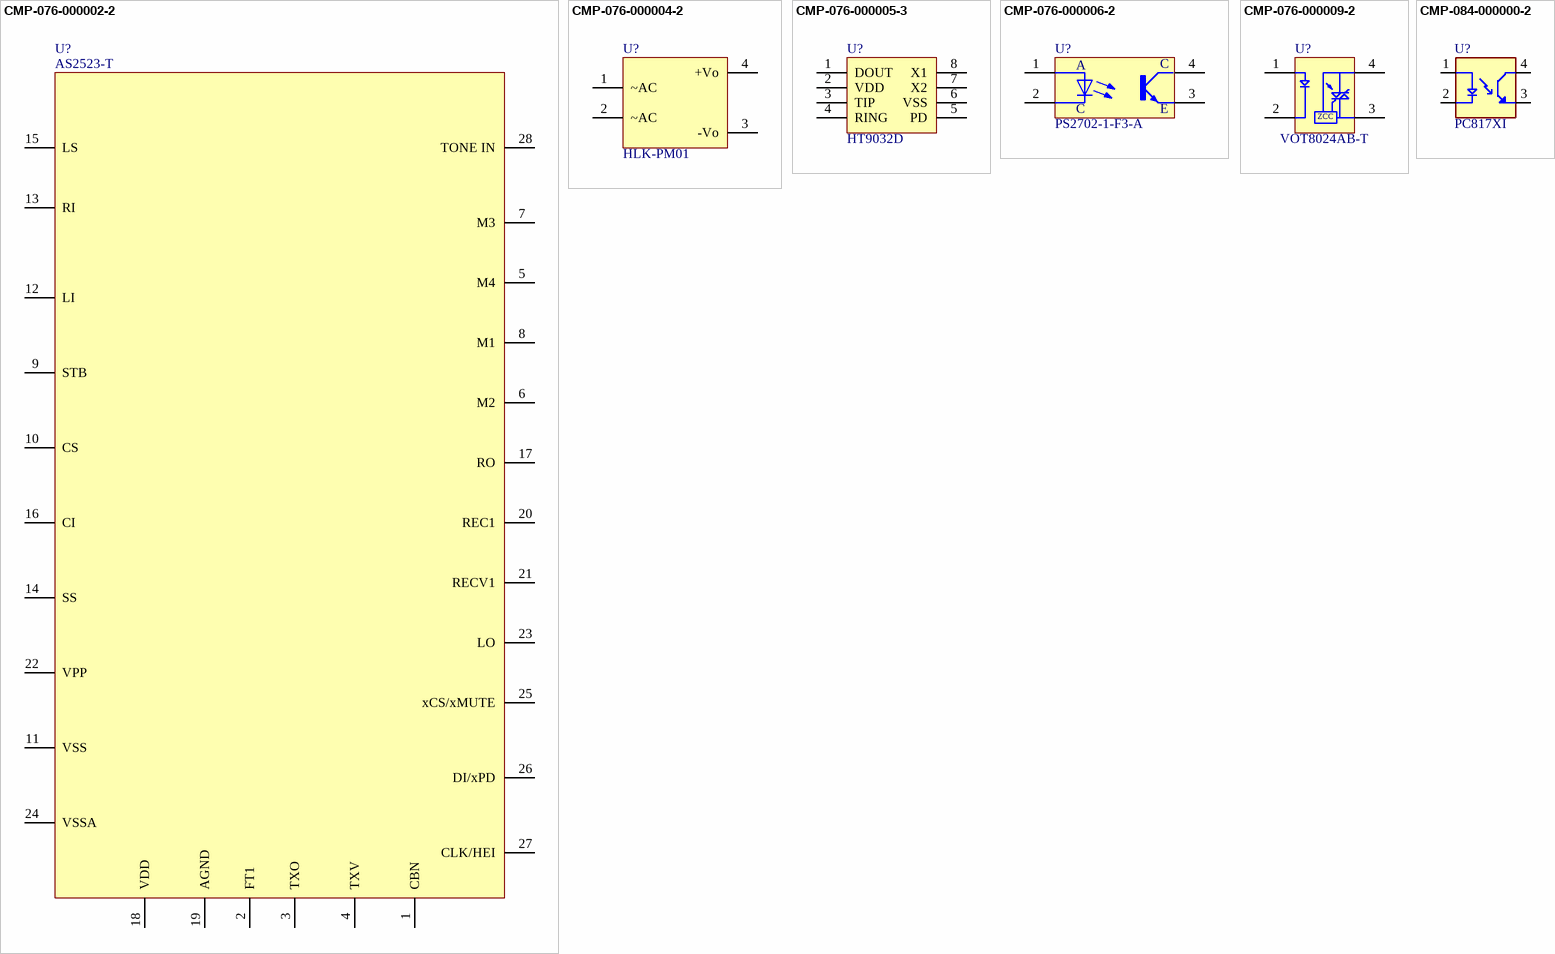
[diagram p3: symbols CMP-076-000002-2 to CMP-084-000000-2]

## CMP-076-000002-2
designator U?, comment AS2523-T
AS Series 3 to 5 V Telephone Line Interface and Speakerphone Circuit - SOIC-28; Manufacturer: ams TAOS; Manufacturer: ams; Interface: Serial; Max Supply Voltage: 5V; Min Supply Voltage: 3V; Number of Circuits: 1; Operating Supply Current: 3mA; Design Item ID: AS2523T; Pin Count: 28; RoHS Compliant: Yes; Case/Package: SOIC; Lead Free: Lead Free; Max Operating Temperature: 70°C; Min Operating Temperature: -25°C; Mounting Technology: Surface Mount; Pins: 28; Package Quantity: 1500; Packaging: Tape and Reel; Weight: 0.078125oz; Manufacturer Part Number: AS2523-T; Component Type: Integrated Circuits
footprint AS2523
pins: 1 CBN, 2 FT1, 3 TXO, 4 TXV, 5 M4, 6 M2, 7 M3, 8 M1, 9 STB, 10 CS, 11 VSS, 12 LI, 13 RI, 14 SS, 15 LS, 16 CI, 17 RO, 18 VDD, 19 AGND, 20 REC1, 21 RECV1, 22 VPP, 23 LO, 24 VSSA, 25 xCS/xMUTE, 26 DI/xPD, 27 CLK/HEI, 28 TONE IN

## CMP-076-000004-2
designator U?, comment HLK-PM01
AC-DC Module HLK-PM01 5V 3W Hi-Link; Max Supply Voltage: 240V; Min Supply Voltage: 100V; Nominal Supply Current: 200mA; Output Current: 600mA; Efficiency: 70%; Design Item ID: HLK-PM01; Max Operating Temperature: 60°C; Min Operating Temperature: -25°C; Output Voltage: 5V; Pins: 4; Manufacture: Hi-Link; Manufacturer: Hi-Link; Manufacturer Part Number: HLK-PM01; Component Type: Power Supply
footprint HLK-PMO1
pins: 1 ~AC, 2 ~AC, 3 -Vo, 4 +Vo

## CMP-076-000005-3
designator U?, comment HT9032D
SOP-8 Telecommunication Interface ICs ROHS; Manufacturer: Holtek; Component Type: Standard; RoHS Compliant: No; Mounting Technology: SMT; Pins: 8; Manufacturer Part Number: HT9032D; Component Type: Integrated Circuits
footprint SSOIC8
pins: 1 DOUT, 2 VDD, 3 TIP, 4 RING, 5 PD, 6 VSS, 7 X2, 8 X1

## CMP-076-000006-2
designator U?, comment PS2702-1-F3-A
High Isolation Voltage Darlington Transistor SOP MULTI Photocoupler Series; Manufacturer: Renesas; Number of Channels: 1; Forward Voltage: 1.4V; Collector Emitter Saturation Voltage: 1V; Collector Emitter Voltage (VCEO): 40V; Isolation Voltage: 3.75kV; Input Type: DC; Reverse Breakdown Voltage: 6V; Forward Current: 50mA; Max Power Dissipation: 150mW; Max Collector Current: 200mA; Current Transfer Ratio: 2000%; Rise Time: 200us; Manufacturer Part Number: PS2702-1-F3-A; Category: Optocouplers; Case/Package: SOP; Min Operating Temperature: -55°C; Max Operating Temperature: 100°C; Packaging: Tape and Reel; Number of Elements: 1; Power Dissipation: 150mW; Max Input Current: 50mA; Output Voltage: 40V; Radiation Hardening: No; Lead Free: Lead Free; RoHS Compliant: Yes; ComponentLink1URL: https://datasheet.ciiva.com/15119/getdatasheetpartid-460023-15119224.pdf?src-supplier=Verical; ComponentLink1Description: https://datasheet.ciiva.com/15119/getdatasheetpartid-460023-15119224.pdf?src-supplier=Verical; Component Type: Standard; Mounting Technology: Surface Mount; Pins: 4; Component Type: Optoelectronics
footprint SOP4
pins: 1 A, 2 C, 3 E, 4 CO

## CMP-076-000009-2
designator U?, comment VOT8024AB-T
Optocoupler Triac AC-OUT 1-Channel 800VDRM 4-Pin Surface Mount T/R; Manufacturer: Vishay; Number of Channels: 1; RMS Current (Irms): 100mA; Hold Current: 400uA; Forward Voltage: 1.2V; Manufacturer Part Number: VOT8024AB-T; RoHS: Yes; Case/Package: SMD/SMT; Min Operating Temperature: -55°C; Max Operating Temperature: 110°C; Series: -; Packaging: Cut Tape; RoHS Compliant: Yes; Design Item ID: VOT8024AB-T; Component Type: Standard; Mounting Technology: Surface Mount; Pins: 4; Component Type: Optoelectronics
footprint SW-TRIAC
pins: 1 A, 2 C, 3 MT1, 4 MT2
text: ZCC

## CMP-084-000000-2
designator U?, comment PC817XI
OPTOISOLATOR 5KV TRANS 4SMD; Manufacturer: Sharp; MF: Sharp Microelectronics; Collector-emitter Voltage-Max: 200mV; Forward Voltage: 1.2V; Input Type: DC; Max Output Voltage: 80V; Number of Channels: 1; Output Current per Channel: 50mA; Component Type: Standard; MP: PC817XI; Package: SMD-4 Sharp Microelectronics; Case/Package: SMD/SMT; Max Operating Temperature: 100°C; Min Operating Temperature: -30°C; Mounting Technology: Surface Mount; Pins: 4; RoHS Compliant: No; Lead Free: Contains Lead; Number of Circuits: 1; Manufacturer Part Number: PC817XI; Component Type: Optoelectronics
footprint SOIC254P975X460-4N
pins: 1 A, 2 C, 3 ET, 4 CT